# Altium footprint library ref-packages.PCBLIB: 1544 footprints (part 19 of 103)
Each footprint in its own frame and in the unit in brackets; x right, y up, seen from the top. Pads: shape width x height; smd on the part's side, far side on the other; paste and mask are expansions set on the pad; w line width, h text height; cw(c..) or ccw(c..) is an arc to the next point about the centre after c.
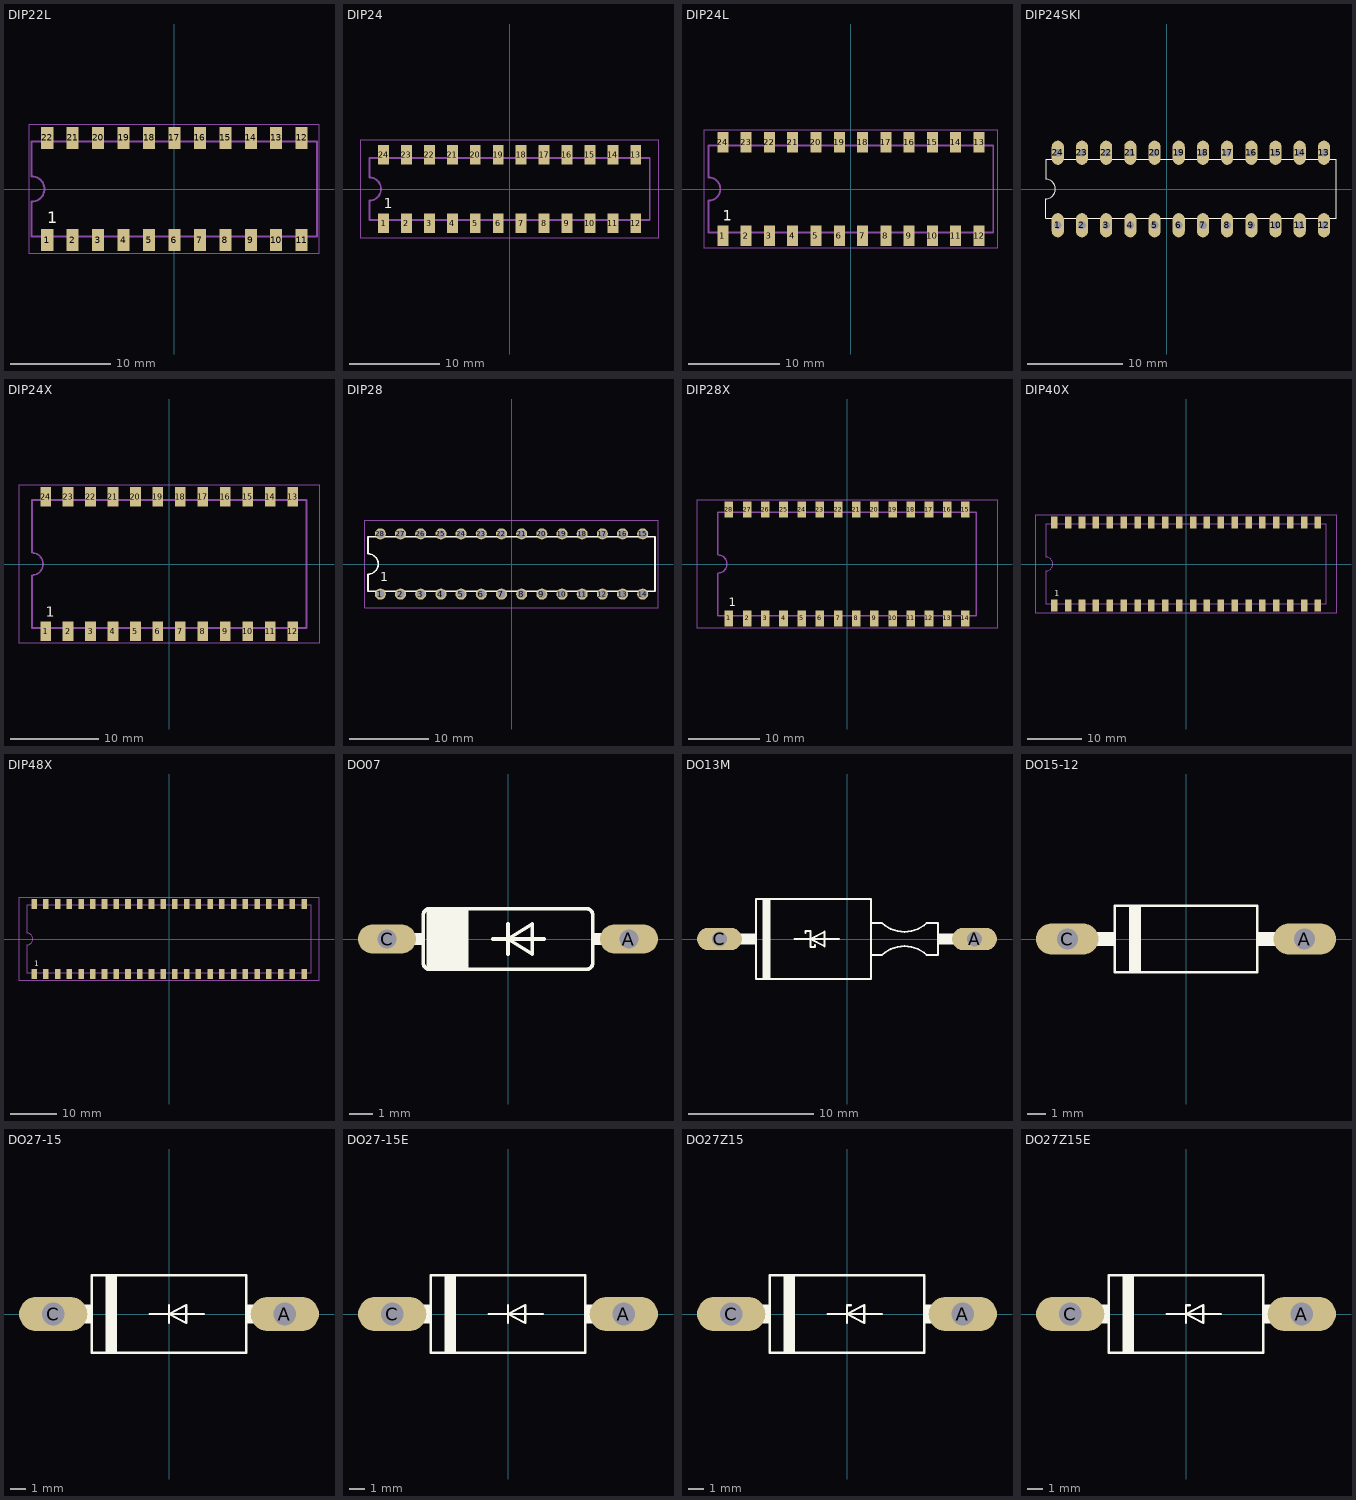
[diagram p18: the footprints below, top view; thin cyan lines are the x and y axes]

## DIP22L [mil]
pads (22):
  rect 47.24x86.61 smd: 1(-500,-200.79) 2(-400,-200.79) 3(-300,-200.79) 4(-200,-200.79) 5(-100,-200.79) 6(0,-200.79) 7(100,-200.79) 8(200,-200.79) 9(300,-200.79) 10(400,-200.79) 11(500,-200.79) 12(500,200.79) 13(400,200.79) 14(300,200.79) 15(200,200.79) 16(100,200.79) 17(0,200.79) 18(-100,200.79) 19(-200,200.79) 20(-300,200.79) 21(-400,200.79) 22(-500,200.79)
Top Overlay:
  text "1" at -500,-151.18 h77.5
Mechanical 16:
  rectangle: -511.02,-213.39 -488.98,-187.01
  rectangle: -411.02,-213.39 -388.98,-187.01
  rectangle: -311.02,-213.39 -288.98,-187.01
  rectangle: -211.02,-213.39 -188.98,-187.01
  rectangle: -111.02,-213.39 -88.98,-187.01
  rectangle: -11.02,-213.39 11.02,-187.01
  rectangle: 88.98,-213.39 111.02,-187.01
  rectangle: 188.98,-213.39 211.02,-187.01
  rectangle: 288.98,-213.39 311.02,-187.01
  rectangle: 388.98,-213.39 411.02,-187.01
  rectangle: 488.98,-213.39 511.02,-187.01
  rectangle: 488.98,187.01 511.02,213.39
  rectangle: 388.98,187.01 411.02,213.39
  rectangle: 288.98,187.01 311.02,213.39
  rectangle: 188.98,187.01 211.02,213.39
  rectangle: 88.98,187.01 111.02,213.39
  rectangle: -11.02,187.01 11.02,213.39
  rectangle: -111.02,187.01 -88.98,213.39
  rectangle: -211.02,187.01 -188.98,213.39
  rectangle: -311.02,187.01 -288.98,213.39
  rectangle: -411.02,187.01 -388.98,213.39
  rectangle: -511.02,187.01 -488.98,213.39
  lines w8: -561.02,-187.01 561.02,-187.01 561.02,187.01 -561.02,187.01 -561.02,50 cw(c-561.02,0) -561.02,-50 -561.02,-187.01
Mechanical 27:
  lines w2: -569.8,-255.24 568.23,-255.24 568.23,255.24 -569.8,255.24 -569.8,-255.24

## DIP24 [mil]
pads (24):
  rect 47.24x86.61 smd: 1(-550,-149.61) 2(-450,-149.61) 3(-350,-149.61) 4(-250,-149.61) 5(-150,-149.61) 6(-50,-149.61) 7(50,-149.61) 8(150,-149.61) 9(250,-149.61) 10(350,-149.61) 11(450,-149.61) 12(550,-149.61) 13(550,149.61) 14(450,149.61) 15(350,149.61) 16(250,149.61) 17(150,149.61) 18(50,149.61) 19(-50,149.61) 20(-150,149.61) 21(-250,149.61) 22(-350,149.61) 23(-450,149.61) 24(-550,149.61)
Top Overlay:
  text "1" at -550,-100 h77.5
Mechanical 16:
  rectangle: -561.02,-162.2 -538.98,-135.83
  rectangle: -461.02,-162.2 -438.98,-135.83
  rectangle: -361.02,-162.2 -338.98,-135.83
  rectangle: -261.02,-162.2 -238.98,-135.83
  rectangle: -161.02,-162.2 -138.98,-135.83
  rectangle: -61.02,-162.2 -38.98,-135.83
  rectangle: 38.98,-162.2 61.02,-135.83
  rectangle: 138.98,-162.2 161.02,-135.83
  rectangle: 238.98,-162.2 261.02,-135.83
  rectangle: 338.98,-162.2 361.02,-135.83
  rectangle: 438.98,-162.2 461.02,-135.83
  rectangle: 538.98,-162.2 561.02,-135.83
  rectangle: 538.98,135.83 561.02,162.2
  rectangle: 438.98,135.83 461.02,162.2
  rectangle: 338.98,135.83 361.02,162.2
  rectangle: 238.98,135.83 261.02,162.2
  rectangle: 138.98,135.83 161.02,162.2
  rectangle: 38.98,135.83 61.02,162.2
  rectangle: -61.02,135.83 -38.98,162.2
  rectangle: -161.02,135.83 -138.98,162.2
  rectangle: -261.02,135.83 -238.98,162.2
  rectangle: -361.02,135.83 -338.98,162.2
  rectangle: -461.02,135.83 -438.98,162.2
  rectangle: -561.02,135.83 -538.98,162.2
  lines w8: -611.22,-50.2 ccw(c-611.22,0) -611.22,50.2 ; -611.02,-50 -611.02,-135.83 611.02,-135.83 611.02,135.83 -611.02,135.83 -611.02,50
Mechanical 27:
  lines w2: -648.54,-215.87 646.97,-215.87 646.97,215.87 -648.54,215.87 -648.54,-215.87

## DIP24L [mil]
pads (24):
  rect 47.24x86.61 smd: 1(-550,-200.79) 2(-450,-200.79) 3(-350,-200.79) 4(-250,-200.79) 5(-150,-200.79) 6(-50,-200.79) 7(50,-200.79) 8(150,-200.79) 9(250,-200.79) 10(350,-200.79) 11(450,-200.79) 12(550,-200.79) 13(550,200.79) 14(450,200.79) 15(350,200.79) 16(250,200.79) 17(150,200.79) 18(50,200.79) 19(-50,200.79) 20(-150,200.79) 21(-250,200.79) 22(-350,200.79) 23(-450,200.79) 24(-550,200.79)
Top Overlay:
  text "1" at -550,-151.18 h77.5
Mechanical 16:
  rectangle: -561.02,-213.39 -538.98,-187.01
  rectangle: -461.02,-213.39 -438.98,-187.01
  rectangle: -361.02,-213.39 -338.98,-187.01
  rectangle: -261.02,-213.39 -238.98,-187.01
  rectangle: -161.02,-213.39 -138.98,-187.01
  rectangle: -61.02,-213.39 -38.98,-187.01
  rectangle: 38.98,-213.39 61.02,-187.01
  rectangle: 138.98,-213.39 161.02,-187.01
  rectangle: 238.98,-213.39 261.02,-187.01
  rectangle: 338.98,-213.39 361.02,-187.01
  rectangle: 438.98,-213.39 461.02,-187.01
  rectangle: 538.98,-213.39 561.02,-187.01
  rectangle: 538.98,187.01 561.02,213.39
  rectangle: 438.98,187.01 461.02,213.39
  rectangle: 338.98,187.01 361.02,213.39
  rectangle: 238.98,187.01 261.02,213.39
  rectangle: 138.98,187.01 161.02,213.39
  rectangle: 38.98,187.01 61.02,213.39
  rectangle: -61.02,187.01 -38.98,213.39
  rectangle: -161.02,187.01 -138.98,213.39
  rectangle: -261.02,187.01 -238.98,213.39
  rectangle: -361.02,187.01 -338.98,213.39
  rectangle: -461.02,187.01 -438.98,213.39
  rectangle: -561.02,187.01 -538.98,213.39
  lines w8: -611.02,-187.01 611.02,-187.01 611.02,187.01 -611.02,187.01 -611.02,50 cw(c-611.02,0) -611.02,-50 -611.02,-187.01
Mechanical 27:
  lines w2: -628.86,-255.24 627.28,-255.24 627.28,255.24 -628.86,255.24 -628.86,-255.24

## DIP24SKI [mil]
pads (24):
  oval 50x100 hole 32: 1(-450,-150) 2(-350,-150) 3(-250,-150) 4(-150,-150) 5(-50,-150) 6(50,-150) 7(150,-150) 8(250,-150) 9(350,-150) 10(450,-150) 11(550,-150) 12(650,-150) 13(650,150) 14(550,150) 15(450,150) 16(350,150) 17(250,150) 18(150,150) 19(50,150) 20(-50,150) 21(-150,150) 22(-250,150) 23(-350,150) 24(-450,150)
Top Overlay:
  lines w5: -500,-120 700,-120 700,120 -500,120 -500,40 cw(c-500,0) -500,-40 -500,-120

## DIP24X [mil]
pads (24):
  rect 47.24x86.61 smd: 1(-550,-299.21) 2(-450,-299.21) 3(-350,-299.21) 4(-250,-299.21) 5(-150,-299.21) 6(-50,-299.21) 7(50,-299.21) 8(150,-299.21) 9(250,-299.21) 10(350,-299.21) 11(450,-299.21) 12(550,-299.21) 13(550,299.21) 14(450,299.21) 15(350,299.21) 16(250,299.21) 17(150,299.21) 18(50,299.21) 19(-50,299.21) 20(-150,299.21) 21(-250,299.21) 22(-350,299.21) 23(-450,299.21) 24(-550,299.21)
Top Overlay:
  text "1" at -550,-249.61 h77.5
Mechanical 16:
  rectangle: -561.02,-311.81 -538.98,-285.43
  rectangle: -461.02,-311.81 -438.98,-285.43
  rectangle: -361.02,-311.81 -338.98,-285.43
  rectangle: -261.02,-311.81 -238.98,-285.43
  rectangle: -161.02,-311.81 -138.98,-285.43
  rectangle: -61.02,-311.81 -38.98,-285.43
  rectangle: 38.98,-311.81 61.02,-285.43
  rectangle: 138.98,-311.81 161.02,-285.43
  rectangle: 238.98,-311.81 261.02,-285.43
  rectangle: 338.98,-311.81 361.02,-285.43
  rectangle: 438.98,-311.81 461.02,-285.43
  rectangle: 538.98,-311.81 561.02,-285.43
  rectangle: 538.98,285.43 561.02,311.81
  rectangle: 438.98,285.43 461.02,311.81
  rectangle: 338.98,285.43 361.02,311.81
  rectangle: 238.98,285.43 261.02,311.81
  rectangle: 138.98,285.43 161.02,311.81
  rectangle: 38.98,285.43 61.02,311.81
  rectangle: -61.02,285.43 -38.98,311.81
  rectangle: -161.02,285.43 -138.98,311.81
  rectangle: -261.02,285.43 -238.98,311.81
  rectangle: -361.02,285.43 -338.98,311.81
  rectangle: -461.02,285.43 -438.98,311.81
  rectangle: -561.02,285.43 -538.98,311.81
  lines w8: -611.02,-285.43 611.02,-285.43 611.02,285.43 -611.02,285.43 -611.02,50 cw(c-611.02,0) -611.02,-50 -611.02,-285.43
Mechanical 27:
  lines w2: -668.23,-353.66 666.65,-353.66 666.65,353.66 -668.23,353.66 -668.23,-353.66

## DIP28 [mil]
pads (28):
  round 55 hole 40: 1(-650,-149.61) 2(-550,-149.61) 3(-450,-149.61) 4(-350,-149.61) 5(-250,-149.61) 6(-150,-149.61) 7(-50,-149.61) 8(50,-149.61) 9(150,-149.61) 10(250,-149.61) 11(350,-149.61) 12(450,-149.61) 13(550,-149.61) 14(650,-149.61) 15(650,149.61) 16(550,149.61) 17(450,149.61) 18(350,149.61) 19(250,149.61) 20(150,149.61) 21(50,149.61) 22(-50,149.61) 23(-150,149.61) 24(-250,149.61) 25(-350,149.61) 26(-450,149.61) 27(-550,149.61) 28(-650,149.61)
Top Overlay:
  rectangle: -661.02,-162.2 -638.98,-135.83
  rectangle: -561.02,-162.2 -538.98,-135.83
  rectangle: -461.02,-162.2 -438.98,-135.83
  rectangle: -361.02,-162.2 -338.98,-135.83
  rectangle: -261.02,-162.2 -238.98,-135.83
  rectangle: -161.02,-162.2 -138.98,-135.83
  rectangle: -61.02,-162.2 -38.98,-135.83
  rectangle: 38.98,-162.2 61.02,-135.83
  rectangle: 138.98,-162.2 161.02,-135.83
  rectangle: 238.98,-162.2 261.02,-135.83
  rectangle: 338.98,-162.2 361.02,-135.83
  rectangle: 438.98,-162.2 461.02,-135.83
  rectangle: 538.98,-162.2 561.02,-135.83
  rectangle: 638.98,-162.2 661.02,-135.83
  rectangle: 638.98,135.83 661.02,162.2
  rectangle: 538.98,135.83 561.02,162.2
  rectangle: 438.98,135.83 461.02,162.2
  rectangle: 338.98,135.83 361.02,162.2
  rectangle: 238.98,135.83 261.02,162.2
  rectangle: 138.98,135.83 161.02,162.2
  rectangle: 38.98,135.83 61.02,162.2
  rectangle: -61.02,135.83 -38.98,162.2
  rectangle: -161.02,135.83 -138.98,162.2
  rectangle: -261.02,135.83 -238.98,162.2
  rectangle: -361.02,135.83 -338.98,162.2
  rectangle: -461.02,135.83 -438.98,162.2
  rectangle: -561.02,135.83 -538.98,162.2
  rectangle: -661.02,135.83 -638.98,162.2
  lines w8: -711.02,-50 -711.02,-135.83 711.02,-135.83 711.02,135.83 -711.02,135.83 -711.02,50 ; -710.63,-50.2 ccw(c-710.63,0) -710.63,50.2
  text "1" at -650,-100 h77.5
Mechanical 27:
  lines w2: -727.28,-215.87 725.71,-215.87 725.71,215.87 -727.28,215.87 -727.28,-215.87

## DIP28X [mil]
pads (28):
  rect 47.24x86.61 smd: 1(-650,-299.21) 2(-550,-299.21) 3(-450,-299.21) 4(-350,-299.21) 5(-250,-299.21) 6(-150,-299.21) 7(-50,-299.21) 8(50,-299.21) 9(150,-299.21) 10(250,-299.21) 11(350,-299.21) 12(450,-299.21) 13(550,-299.21) 14(650,-299.21) 15(650,299.21) 16(550,299.21) 17(450,299.21) 18(350,299.21) 19(250,299.21) 20(150,299.21) 21(50,299.21) 22(-50,299.21) 23(-150,299.21) 24(-250,299.21) 25(-350,299.21) 26(-450,299.21) 27(-550,299.21) 28(-650,299.21)
Top Overlay:
  text "1" at -650,-249.61 h77.5
Mechanical 16:
  rectangle: -661.02,-311.81 -638.98,-285.43
  rectangle: -561.02,-311.81 -538.98,-285.43
  rectangle: -461.02,-311.81 -438.98,-285.43
  rectangle: -361.02,-311.81 -338.98,-285.43
  rectangle: -261.02,-311.81 -238.98,-285.43
  rectangle: -161.02,-311.81 -138.98,-285.43
  rectangle: -61.02,-311.81 -38.98,-285.43
  rectangle: 38.98,-311.81 61.02,-285.43
  rectangle: 138.98,-311.81 161.02,-285.43
  rectangle: 238.98,-311.81 261.02,-285.43
  rectangle: 338.98,-311.81 361.02,-285.43
  rectangle: 438.98,-311.81 461.02,-285.43
  rectangle: 538.98,-311.81 561.02,-285.43
  rectangle: 638.98,-311.81 661.02,-285.43
  rectangle: 638.98,285.43 661.02,311.81
  rectangle: 538.98,285.43 561.02,311.81
  rectangle: 438.98,285.43 461.02,311.81
  rectangle: 338.98,285.43 361.02,311.81
  rectangle: 238.98,285.43 261.02,311.81
  rectangle: 138.98,285.43 161.02,311.81
  rectangle: 38.98,285.43 61.02,311.81
  rectangle: -61.02,285.43 -38.98,311.81
  rectangle: -161.02,285.43 -138.98,311.81
  rectangle: -261.02,285.43 -238.98,311.81
  rectangle: -361.02,285.43 -338.98,311.81
  rectangle: -461.02,285.43 -438.98,311.81
  rectangle: -561.02,285.43 -538.98,311.81
  rectangle: -661.02,285.43 -638.98,311.81
  lines w8: -711.02,-285.43 711.02,-285.43 711.02,285.43 -711.02,285.43 -711.02,50 cw(c-711.02,0) -711.02,-50 -711.02,-285.43
Mechanical 27:
  lines w2: -825.71,-353.66 824.13,-353.66 824.13,353.66 -825.71,353.66 -825.71,-353.66

## DIP40X [mil]
pads (40):
  rect 47.24x86.61 smd: 1(-950,-299.21) 2(-850,-299.21) 3(-750,-299.21) 4(-650,-299.21) 5(-550,-299.21) 6(-450,-299.21) 7(-350,-299.21) 8(-250,-299.21) 9(-150,-299.21) 10(-50,-299.21) 11(50,-299.21) 12(150,-299.21) 13(250,-299.21) 14(350,-299.21) 15(450,-299.21) 16(550,-299.21) 17(650,-299.21) 18(750,-299.21) 19(850,-299.21) 20(950,-299.21) 21(950,299.21) 22(850,299.21) 23(750,299.21) 24(650,299.21) 25(550,299.21) 26(450,299.21) 27(350,299.21) 28(250,299.21) 29(150,299.21) 30(50,299.21) 31(-50,299.21) 32(-150,299.21) 33(-250,299.21) 34(-350,299.21) 35(-450,299.21) 36(-550,299.21) 37(-650,299.21) 38(-750,299.21) 39(-850,299.21) 40(-950,299.21)
Top Overlay:
  text "1" at -950,-249.61 h77.5
Mechanical 16:
  rectangle: -961.02,-311.81 -938.98,-285.43
  rectangle: -861.02,-311.81 -838.98,-285.43
  rectangle: -761.02,-311.81 -738.98,-285.43
  rectangle: -661.02,-311.81 -638.98,-285.43
  rectangle: -561.02,-311.81 -538.98,-285.43
  rectangle: -461.02,-311.81 -438.98,-285.43
  rectangle: -361.02,-311.81 -338.98,-285.43
  rectangle: -261.02,-311.81 -238.98,-285.43
  rectangle: -161.02,-311.81 -138.98,-285.43
  rectangle: -61.02,-311.81 -38.98,-285.43
  rectangle: 38.98,-311.81 61.02,-285.43
  rectangle: 138.98,-311.81 161.02,-285.43
  rectangle: 238.98,-311.81 261.02,-285.43
  rectangle: 338.98,-311.81 361.02,-285.43
  rectangle: 438.98,-311.81 461.02,-285.43
  rectangle: 538.98,-311.81 561.02,-285.43
  rectangle: 638.98,-311.81 661.02,-285.43
  rectangle: 738.98,-311.81 761.02,-285.43
  rectangle: 838.98,-311.81 861.02,-285.43
  rectangle: 938.98,-311.81 961.02,-285.43
  rectangle: 938.98,285.43 961.02,311.81
  rectangle: 838.98,285.43 861.02,311.81
  rectangle: 738.98,285.43 761.02,311.81
  rectangle: 638.98,285.43 661.02,311.81
  rectangle: 538.98,285.43 561.02,311.81
  rectangle: 438.98,285.43 461.02,311.81
  rectangle: 338.98,285.43 361.02,311.81
  rectangle: 238.98,285.43 261.02,311.81
  rectangle: 138.98,285.43 161.02,311.81
  rectangle: 38.98,285.43 61.02,311.81
  rectangle: -61.02,285.43 -38.98,311.81
  rectangle: -161.02,285.43 -138.98,311.81
  rectangle: -261.02,285.43 -238.98,311.81
  rectangle: -361.02,285.43 -338.98,311.81
  rectangle: -461.02,285.43 -438.98,311.81
  rectangle: -561.02,285.43 -538.98,311.81
  rectangle: -661.02,285.43 -638.98,311.81
  rectangle: -761.02,285.43 -738.98,311.81
  rectangle: -861.02,285.43 -838.98,311.81
  rectangle: -961.02,285.43 -938.98,311.81
  lines w8: -1011.02,-50 -1011.02,-285.43 1011.02,-285.43 1011.02,285.43 -1011.02,285.43 -1011.02,50 ; -1010.83,-50.2 ccw(c-1010.83,0) -1010.83,50.2
Mechanical 27:
  lines w2: -1081.61,-353.66 1080.04,-353.66 1080.04,353.66 -1081.61,353.66 -1081.61,-353.66

## DIP48X [mil]
pads (48):
  rect 47.24x86.61 smd: 1(-1150,-299.21) 2(-1050,-299.21) 3(-950,-299.21) 4(-850,-299.21) 5(-750,-299.21) 6(-650,-299.21) 7(-550,-299.21) 8(-450,-299.21) 9(-350,-299.21) 10(-250,-299.21) 11(-150,-299.21) 12(-50,-299.21) 13(50,-299.21) 14(150,-299.21) 15(250,-299.21) 16(350,-299.21) 17(450,-299.21) 18(550,-299.21) 19(650,-299.21) 20(750,-299.21) 21(850,-299.21) 22(950,-299.21) 23(1050,-299.21) 24(1150,-299.21) 25(1150,299.21) 26(1050,299.21) 27(950,299.21) 28(850,299.21) 29(750,299.21) 30(650,299.21) 31(550,299.21) 32(450,299.21) 33(350,299.21) 34(250,299.21) 35(150,299.21) 36(50,299.21) 37(-50,299.21) 38(-150,299.21) 39(-250,299.21) 40(-350,299.21) 41(-450,299.21) 42(-550,299.21) 43(-650,299.21) 44(-750,299.21) 45(-850,299.21) 46(-950,299.21) 47(-1050,299.21) 48(-1150,299.21)
Top Overlay:
  text "1" at -1150,-249.61 h77.5
Mechanical 16:
  rectangle: -1161.02,-311.81 -1138.98,-285.43
  rectangle: -1061.02,-311.81 -1038.98,-285.43
  rectangle: -961.02,-311.81 -938.98,-285.43
  rectangle: -861.02,-311.81 -838.98,-285.43
  rectangle: -761.02,-311.81 -738.98,-285.43
  rectangle: -661.02,-311.81 -638.98,-285.43
  rectangle: -561.02,-311.81 -538.98,-285.43
  rectangle: -461.02,-311.81 -438.98,-285.43
  rectangle: -361.02,-311.81 -338.98,-285.43
  rectangle: -261.02,-311.81 -238.98,-285.43
  rectangle: -161.02,-311.81 -138.98,-285.43
  rectangle: -61.02,-311.81 -38.98,-285.43
  rectangle: 38.98,-311.81 61.02,-285.43
  rectangle: 138.98,-311.81 161.02,-285.43
  rectangle: 238.98,-311.81 261.02,-285.43
  rectangle: 338.98,-311.81 361.02,-285.43
  rectangle: 438.98,-311.81 461.02,-285.43
  rectangle: 538.98,-311.81 561.02,-285.43
  rectangle: 638.98,-311.81 661.02,-285.43
  rectangle: 738.98,-311.81 761.02,-285.43
  rectangle: 838.98,-311.81 861.02,-285.43
  rectangle: 938.98,-311.81 961.02,-285.43
  rectangle: 1038.98,-311.81 1061.02,-285.43
  rectangle: 1138.98,-311.81 1161.02,-285.43
  rectangle: 1138.98,285.43 1161.02,311.81
  rectangle: 1038.98,285.43 1061.02,311.81
  rectangle: 938.98,285.43 961.02,311.81
  rectangle: 838.98,285.43 861.02,311.81
  rectangle: 738.98,285.43 761.02,311.81
  rectangle: 638.98,285.43 661.02,311.81
  rectangle: 538.98,285.43 561.02,311.81
  rectangle: 438.98,285.43 461.02,311.81
  rectangle: 338.98,285.43 361.02,311.81
  rectangle: 238.98,285.43 261.02,311.81
  rectangle: 138.98,285.43 161.02,311.81
  rectangle: 38.98,285.43 61.02,311.81
  rectangle: -61.02,285.43 -38.98,311.81
  rectangle: -161.02,285.43 -138.98,311.81
  rectangle: -261.02,285.43 -238.98,311.81
  rectangle: -361.02,285.43 -338.98,311.81
  rectangle: -461.02,285.43 -438.98,311.81
  rectangle: -561.02,285.43 -538.98,311.81
  rectangle: -661.02,285.43 -638.98,311.81
  rectangle: -761.02,285.43 -738.98,311.81
  rectangle: -861.02,285.43 -838.98,311.81
  rectangle: -961.02,285.43 -938.98,311.81
  rectangle: -1061.02,285.43 -1038.98,311.81
  rectangle: -1161.02,285.43 -1138.98,311.81
  lines w8: -1211.02,-50 -1211.02,-285.43 1211.02,-285.43 1211.02,285.43 -1211.02,285.43 -1211.02,50 ; -1210.63,-50.2 ccw(c-1210.63,0) -1210.63,50.2
Mechanical 27:
  lines w2: -1278.46,-353.66 1276.89,-353.66 1276.89,353.66 -1278.46,353.66 -1278.46,-353.66

## DO07 [mil]
pads (2):
  oval 96x48 hole 32: A(200,0) C(-200,0)
Top Overlay:
  rectangle: -135,-50 -65,50
  rectangle: 140,-10 165,10
  rectangle: -165,-10 -140,10
  lines w6: -25,0 0,0 ; 0,-25 0,0 ; 0,25 0,0 ; 60,0 0,0 ; 0,0 40,-25 40,25 0,0 ; -140,-40 ccw(c-130,-40) -130,-50 130,-50 ccw(c130,-40) 140,-40 140,40 ccw(c130,40) 130,50 -130,50 ccw(c-130,40) -140,40 -140,-40
Mechanical 16:
  lines w20: -200,0 -165,0 ; 165,0 200,0

## DO13M [mil]
pads (2):
  oval 141x70.5 hole 47: A(400,0) C(-400,0)
Top Overlay:
  rectangle: 285,-17 343,17
  rectangle: -343,-17 -285,17
  rectangle: -265,-125 -240,125
  lines w6: -165,0 -115,0 ; -130,18 -130,25 -115,25 -115,0 ; -100,-18 -100,-25 -115,-25 -115,0 ; -25,0 -115,0 ; -115,0 -70,23 -70,-23 -115,0 ; 75,-50 75,-125 -285,-125 -285,125 75,125 75,50 ; 75,-50 75,50 ; 75,-50 110,-50 cw(c180,-125) 250,-50 285,-50 285,50 250,50 cw(c180,125) 110,50 75,50
Mechanical 16:
  lines w36: -400,0 -340,0 ; 340,0 400,0

## DO15-12 [mil]
pads (2):
  oval 132x66 hole 44: A(250,0) C(-250,0)
Top Overlay:
  rectangle: -120,-70 -95,70
  rectangle: -205,-15 -150,15
  rectangle: 150,-15 205,15
  lines w6: -150,-70 150,-70 150,70 -150,70 -150,-70
Mechanical 16:
  lines w30: -250,0 -210,0 ; 210,0 250,0

## DO27-15 [mil]
pads (2):
  oval 177x88.5 hole 59: A(300,0) C(-300,0)
Top Overlay:
  rectangle: -165,-100 -135,100
  rectangle: -235,-25 -200,25
  rectangle: 200,-25 235,25
  lines w6: -50,0 0,0 ; 0,-23 0,0 ; 0,23 0,0 ; 90,0 0,0 ; 0,0 45,23 45,-23 0,0 ; -200,-100 -200,100 200,100 200,-100 -200,-100
Mechanical 16:
  lines w50: -300,0 -245,0 ; 245,0 300,0

## DO27-15E [mil]
pads (2):
  oval 177x88.5 hole 59: A(300,0) C(-300,0)
Top Overlay:
  rectangle: -165,-100 -135,100
  rectangle: -220,-25 -200,25
  rectangle: 200,-25 220,25
  lines w6: -50,0 0,0 ; 0,-23 0,0 ; 0,23 0,0 ; 90,0 0,0 ; 0,0 45,23 45,-23 0,0 ; -200,-100 -200,100 200,100 200,-100 -200,-100
Mechanical 16:
  lines w50: -300,0 -230,0 ; 230,0 300,0

## DO27Z15 [mil]
pads (2):
  oval 177x88.5 hole 59: A(300,0) C(-300,0)
Top Overlay:
  rectangle: -165,-100 -135,100
  rectangle: -235,-25 -200,25
  rectangle: 200,-25 235,25
  lines w6: -50,0 0,0 ; 0,-23 0,0 ; 10,23 0,23 0,0 ; 90,0 0,0 ; 0,0 45,23 45,-23 0,0 ; -200,-100 -200,100 200,100 200,-100 -200,-100
Mechanical 16:
  lines w50: -300,0 -245,0 ; 245,0 300,0

## DO27Z15E [mil]
pads (2):
  oval 177x88.5 hole 59: A(300,0) C(-300,0)
Top Overlay:
  rectangle: -165,-100 -135,100
  rectangle: 200,-25 220,25
  rectangle: -220,-25 -200,25
  lines w6: -50,0 0,0 ; 0,-23 0,0 ; 10,23 0,23 0,0 ; 90,0 0,0 ; 0,0 45,23 45,-23 0,0 ; -200,-100 -200,100 200,100 200,-100 -200,-100
Mechanical 16:
  lines w50: -300,0 -230,0 ; 230,0 300,0